# Altium footprint library Chronos.PcbLib: 65 footprints (part 1 of 5)
Each footprint in its own frame and in the unit in brackets; x right, y up, seen from the top. Pads: shape width x height; smd on the part's side, far side on the other; paste and mask are expansions set on the pad; w line width, h text height; cw(c..) or ccw(c..) is an arc to the next point about the centre after c.
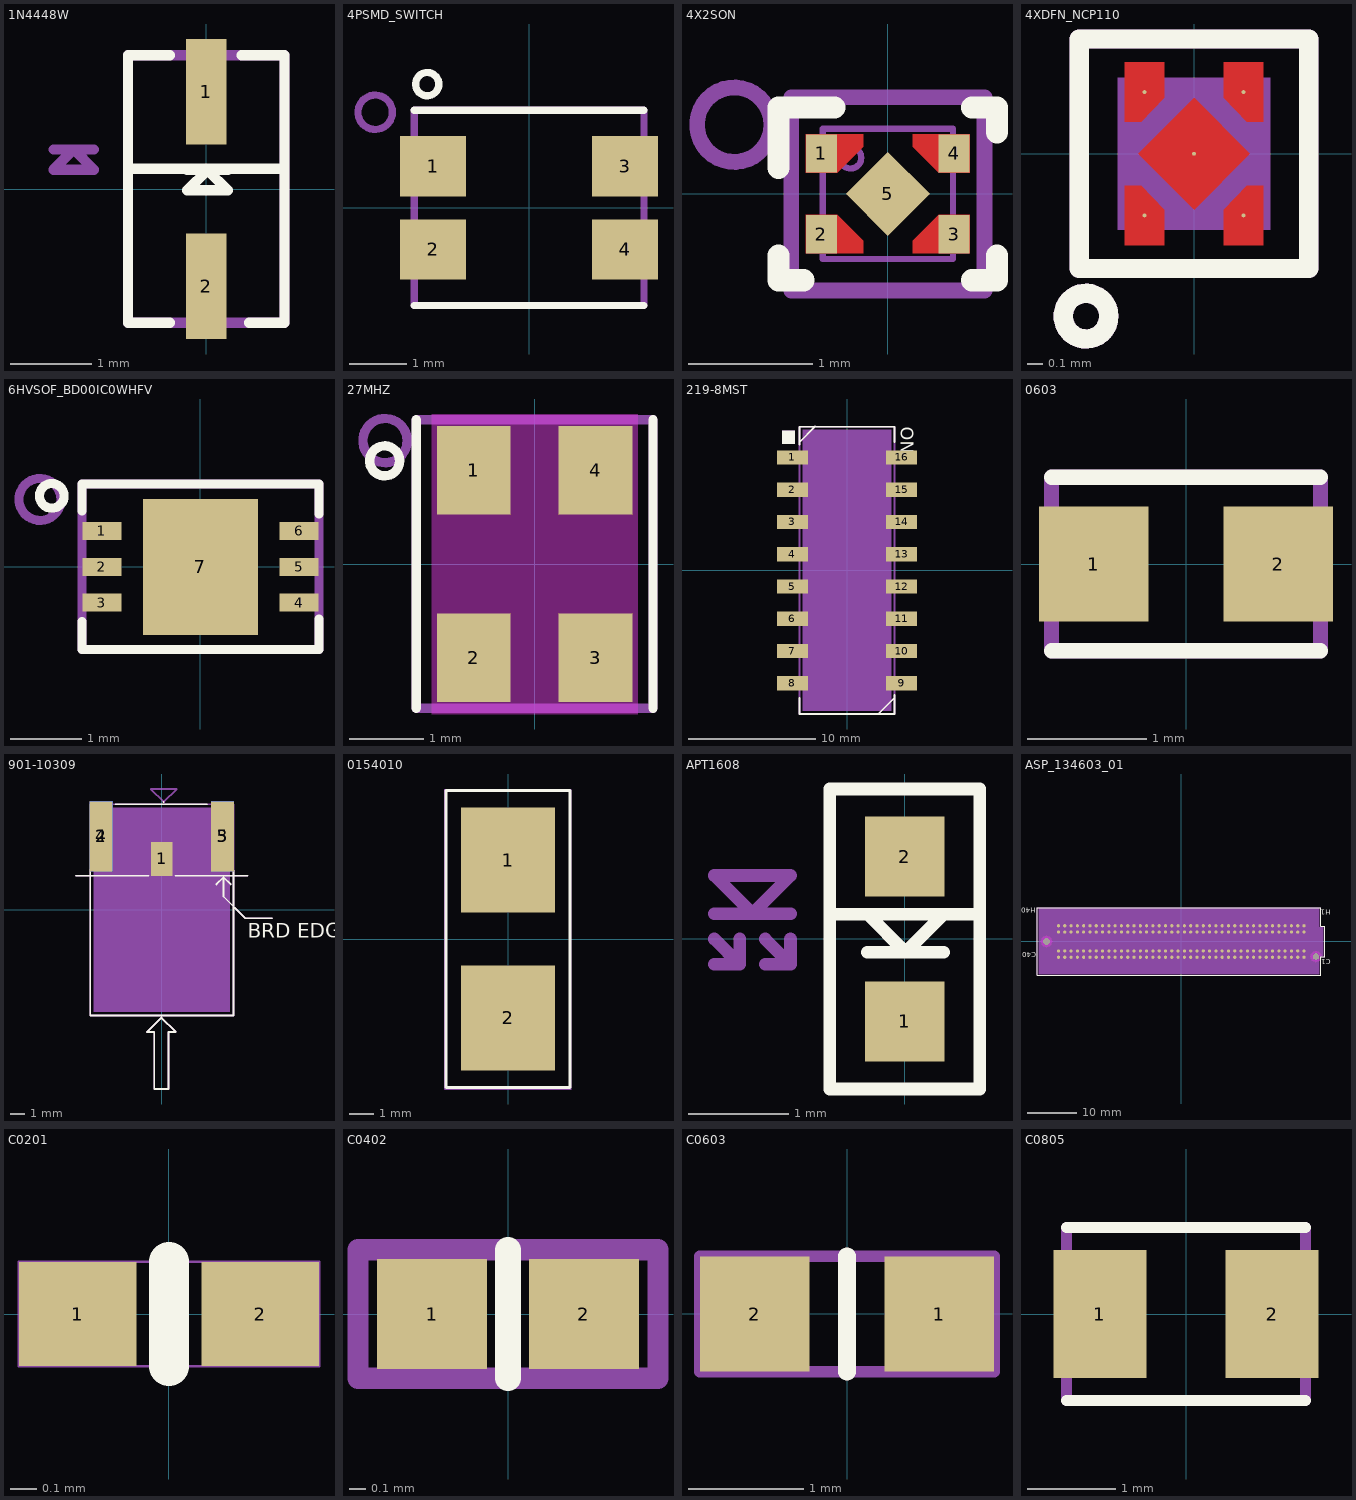
[diagram p0: the footprints below, top view; thin cyan lines are the x and y axes]

## 1N4448W [mm] "1N4448W"
pads (2):
  rect 0.5x1.3 smd: 1(0,1.2) 2(0,-1.2)
Top Overlay:
  lines w0.127: -0.889,0.254 -0.889,0.249 0.889,0.249 0.889,0.254 ; -0.45,-1.651 -0.965,-1.651 -0.965,1.651 -0.45,1.651 ; -0.234,0.234 0.267,0.234 ; 0.435,1.651 0.965,1.651 0.965,-1.651 0.528,-1.651 ; -0.234,-0.015 0.015,0.234 0.267,-0.015 -0.234,-0.015
Top Assembly:
  lines w0.127: -1.885,0.488 -1.384,0.488 ; -1.885,0.239 -1.636,0.488 -1.384,0.239 -1.885,0.239 ; -0.965,-1.651 0.965,-1.651 0.965,1.651 -0.965,1.651 -0.965,-1.651
  text ".Designator" at 1.219,0.508 h1.02
Mechanical 29:
  text "1" at 0.508,1.2 h0.64
  text "2" at 0.508,-1.2 h0.64
3D body "SOD-123.STEP": height 1.35, standoff 0, extent -0.775,-1.864 0.775,1.864

## 4PSMD_SWITCH [mm] "4PSMD_SWITCH"
pads (4):
  rect 1.15x1.05 smd: 1(-1.675,0.725) 2(-1.675,-0.725) 3(1.675,0.725) 4(1.675,-0.725)
Top Overlay:
  circle w0.127: c-1.778,2.159 r0.203
  lines w0.127: -2.004,-1.704 2.004,-1.704 ; -2.004,1.704 2.004,1.704
  text ".Designator" at -2.921,-2.921 h1.02
Top Assembly:
  circle w0.127: c-2.686,1.668 r0.3
  lines w0.127: -2.004,-1.704 2.004,-1.704 2.004,1.704 -2.004,1.704 -2.004,-1.704
Mechanical 29:
  text "4" at 1.878,-0.725 h0.51
  text "2" at -1.472,-0.725 h0.51
  text "3" at 1.878,0.725 h0.51
  text "1" at -1.472,0.725 h0.51
3D body "434153017835.stp": height 1.7, standoff 0, extent -2.147,-1.45 2.147,1.45

## 4X2SON [mm] "4X2SON"
pads (5):
  rect 0.25x0.31 smd paste-0.142 mask+0: 1(-0.535,0.325) 2(-0.535,-0.325) 3(0.535,-0.325) 4(0.535,0.325)
  rect 0.48x0.48 smd rot 45 paste-0.065 mask+0: 5(0,0)
Top Layer:
  region: -0.66,0.17 -0.66,0.48 -0.2,0.48 -0.2,0.379 -0.409,0.17
  region: 0.66,0.17 0.66,0.48 0.2,0.48 0.2,0.379 0.409,0.17
  region: 0.66,-0.17 0.66,-0.48 0.2,-0.48 0.2,-0.379 0.409,-0.17
  region: -0.66,-0.17 -0.66,-0.48 -0.2,-0.48 -0.2,-0.379 -0.409,-0.17
Top Overlay:
  lines w0.178: -0.88,-0.496 -0.88,-0.696 -0.68,-0.696 ; -0.88,0.21 -0.88,0.696 -0.43,0.696 ; 0.68,-0.696 0.88,-0.696 0.88,-0.496 ; 0.68,0.696 0.88,0.696 0.88,0.496
  text ".Designator" at -2.286,1.27 h0.6
Top Paste:
  region: -0.65,-0.22 -0.65,-0.43 -0.25,-0.43 -0.25,-0.4 -0.43,-0.22
  region: 0.65,-0.22 0.65,-0.43 0.25,-0.43 0.25,-0.4 0.43,-0.22
  region: 0.65,0.22 0.65,0.43 0.25,0.43 0.25,0.4 0.43,0.22
  region: -0.65,0.22 -0.65,0.43 -0.25,0.43 -0.25,0.4 -0.43,0.22
Top Solder:
  region: -0.61,0.22 -0.61,0.43 -0.25,0.43 -0.25,0.4 -0.43,0.22
  region: 0.25,0.43 0.61,0.43 0.61,0.22 0.43,0.22 0.25,0.4
  region: 0.61,-0.22 0.61,-0.43 0.25,-0.43 0.25,-0.4 0.43,-0.22
  region: -0.25,-0.43 -0.61,-0.43 -0.61,-0.22 -0.43,-0.22 -0.25,-0.4
Mechanical 13:
  circle w0.05: c-0.3,0.29 r0.086
  lines w0.05: -0.525,-0.525 -0.525,0.525 0.525,0.525 0.525,-0.525 -0.525,-0.525
Top Assembly:
  circle w0.127: c-1.238,0.557 r0.3
  lines w0.127: -0.779,-0.779 -0.779,0.779 0.779,0.779 0.779,-0.779 -0.779,-0.779
Mechanical 29:
  text "3" at 0.633,-0.325 h0.51
  text "4" at 0.633,0.325 h0.51
  text "1" at -0.227,0.325 h0.51
  text "2" at -0.227,-0.325 h0.51
  text "5" at 0.406,0 h0.51

## 4XDFN_NCP110 [mil] "4XDFN_NCP110"
pads (5):
  round 1 smd: 1(-12.8,-15.94) 2(12.8,-15.94) 3(12.8,15.94) 4(-12.8,15.94) 5(0,0)
Top Layer:
  region: 7.68,23.62 17.92,23.62 17.92,8.26 13.59,8.26 7.68,14.47
  region: -17.92,23.62 -7.68,23.62 -7.68,14.47 -13.59,8.26 -17.92,8.26
  region: 14.47,0 0,14.47 -14.47,0 0,-14.47
  region: 17.92,-23.62 7.68,-23.62 7.68,-14.47 13.59,-8.26 17.92,-8.26
  region: -7.68,-23.62 -17.92,-23.62 -17.92,-8.26 -13.59,-8.26 -7.68,-14.47
Top Overlay:
  circle w5: c-27.93,-42.02 r5.9
  lines w5: -29.69,-29.69 -29.69,29.69 29.69,29.69 29.69,-29.69 -29.69,-29.69
  text ".Designator" at 36.39,120.19 h40
Top 3D Body:
  region: -19.69,19.69 -19.69,-19.69 19.69,-19.69 19.69,19.69
Top Assembly:
  circle w5: c-27.93,-42.02 r5.9
  lines w5: -29.69,-29.69 29.69,-29.69 29.69,29.69 -29.69,29.69 -29.69,-29.69
Mechanical 29:
  text "2" at 12.8,0.06 h20
  text "5" at 0,16 h20
  text "4" at -12.8,31.94 h20
  text "3" at 12.8,31.94 h20
  text "1" at -12.8,0.06 h20
3D body "DQN0004A.stp": height 13.39, standoff -0.79, extent -19.68,-19.68 19.68,19.68

## 6HVSOF_BD00IC0WHFV [mm] "6HVSOF_BD00IC0WHFV"
pads (7):
  rect 0.55x0.25 smd: 1(-1.375,0.5) 2(-1.375,0) 3(-1.375,-0.5) 4(1.375,-0.5) 5(1.375,0) 6(1.375,0.5)
  rect 1.6x1.9 smd: 7(0,0)
Top Overlay:
  lines w0.127: -1.905,1.016 ccw(c-2.075,0.991) -1.903,0.984 ; -1.654,-0.766 -1.654,-1.154 1.654,-1.154 1.654,-0.726 ; -1.654,0.779 -1.654,1.154 1.654,1.154 1.654,0.735
Top Assembly:
  circle w0.127: c-2.24,0.94 r0.293
  lines w0.127: -1.654,-1.154 -1.654,1.154 1.654,1.154 1.654,-1.154 -1.654,-1.154
  text ".Designator" at 2.015,0.317 h1.02
Mechanical 29:
  text "7" at -0.203,0 h0.51
  text "3" at -1.578,-0.5 h0.51
  text "4" at 1.172,-0.5 h0.51
  text "6" at 1.172,0.5 h0.51
  text "1" at -1.578,0.5 h0.51
  text "2" at -1.578,0 h0.51
  text "5" at 1.172,0 h0.51
3D body "HVSOF6_ROM.step": height 0.76, standoff 0, extent -1.53,-0.85 1.568,0.852

## 27MHZ [mm] "27MHZ"
pads (4):
  rect 1x1.2 smd: 1(-0.825,1.27) 2(-0.825,-1.27) 3(0.825,-1.27) 4(0.825,1.27)
Mid-Layer 2 keep-out:
  region: -1.397,2.032 -1.397,-2.032 1.397,-2.032 1.397,2.032
Top Overlay:
  circle w0.127: c-2.032,1.397 r0.203
  lines w0.127: -1.604,-1.954 -1.604,1.954 ; 1.604,-1.954 1.604,1.954
  text ".Designator" at 2.032,3.302 h1.02
Top Assembly:
  circle w0.127: c-2.026,1.672 r0.3
  lines w0.127: -1.604,-1.954 -1.604,1.954 1.604,1.954 1.604,-1.954 -1.604,-1.954
Mechanical 29:
  text "2" at -0.825,-1.067 h0.51
  text "4" at 0.825,1.473 h0.51
  text "1" at -0.825,1.473 h0.51
  text "3" at 0.825,-1.067 h0.51
3D body "Abracon ASVTX-11.STEP": height 0.9, standoff 0, extent -1.26,-1.61 1.26,1.61

## 219-8MST [mil] "219-8MST"
pads (16):
  rect 96x44 smd: 1(-169.5,350) 2(-169.5,250) 3(-169.5,150) 4(-169.5,50) 5(-169.5,-50) 6(-169.5,-150) 7(-169.5,-250) 8(-169.5,-350) 9(169.5,-350) 10(169.5,-250) 11(169.5,-150) 12(169.5,-50) 13(169.5,50) 14(169.5,150) 15(169.5,250) 16(169.5,350)
Top Overlay:
  dashed: -201.38,392.57 -201.38,432.57 -161.38,432.57 -161.38,392.57
  lines w5: -148.34,396.22 -98.34,446.22 ; -147,-395.06 -147,-445 147,-445 147,-384.88 ; -147,389 -147,445 147,445 147,397.73 ; 97.17,-444.88 147.17,-394.88
  text "ON" at 166.44,444.51 h40
  text ".Designator" at 231.85,183.64 h40
Top 3D Body:
  region: -137,435 -137,-435 137,-435 137,435
Top Assembly:
  dashed: -201.38,392.57 -201.38,432.57 -161.38,432.57 -161.38,392.57
  lines w5: -148.34,396.22 -98.34,446.22 ; 97.17,-444.88 147.17,-394.88 ; -147,-445 -147,445 147,445 147,-445 -147,-445
  text "ON" at 166.44,444.51 h40
Mechanical 29:
  text "1" at -169.5,358 h20
  text "2" at -169.5,258 h20
  text "3" at -169.5,158 h20
  text "4" at -169.5,58 h20
  text "5" at -169.5,-42 h20
  text "6" at -169.5,-142 h20
  text "7" at -169.5,-242 h20
  text "8" at -169.5,-342 h20
  text "13" at 169.5,66 h20
  text "12" at 169.5,-34 h20
  text "15" at 169.5,266 h20
  text "10" at 169.5,-234 h20
  text "14" at 169.5,166 h20
  text "9" at 169.5,-342 h20
  text "11" at 169.5,-134 h20
  text "16" at 169.5,366 h20
3D body: height 150, standoff 0, extent -137,-435 137,435

## 0603 [mm] "0603"
pads (2):
  rect 0.92x0.97 smd: 1(-0.775,0) 2(0.775,0)
Top Overlay:
  lines w0.127: -1.129,-0.729 1.129,-0.729 ; -1.129,0.729 1.129,0.729
  text ".Designator" at 3.683,1.143 h1.02
Top Assembly:
  lines w0.127: -1.129,-0.729 -1.129,0.729 1.129,0.729 1.129,-0.729 -1.129,-0.729
Mechanical 29:
  text "1" at -0.978,0 h0.51
  text "2" at 0.572,0 h0.51
3D body "RES 0603.STEP": height 0.45, standoff 0, extent -0.8,-0.419 0.8,0.381

## 901-10309 [mm] "901-10309"
pads (5):
  rect 1.5x2.35 smd: 1(0,3.565)
  rect 1.6x4.9 smd: 2(-4.25,5.14) 3(4.25,5.14)
  rect 1.6x4.9 smd far side: 4(-4.25,5.14) 5(4.25,5.14)
Top Overlay:
  lines w0.127: -6,2.39 -0.928,2.39 ; -5.014,2.851 -5.014,-7.394 5.014,-7.394 5.014,2.767 ; -3.267,7.394 3.168,7.394 ; 0.125,7.557 0.131,7.557 ; 0.945,2.39 6,2.39 ; 3.821,1.783 4.321,2.284 ; 4.821,1.783 4.321,2.284 ; 7.704,-0.585 5.844,-0.585 4.321,0.938 4.321,2.284 ; -1.031,-8.543 -0.031,-7.543 0.969,-8.543 0.469,-8.543 0.469,-12.543 -0.531,-12.543 -0.531,-8.543 -1.031,-8.543
  text "BRD EDGE" at 6.034,-1.956 h1.02
  text ".Designator" at -5.221,6.586 h1.02
Top 3D Body:
  region: -4.76,7.14 -4.76,-7.14 4.76,-7.14 4.76,7.14
Bottom 3D Body:
  region: -4.76,7.14 -4.76,2.39 4.76,2.39 4.76,7.14
Top Assembly:
  lines w0.127: -6,2.39 6,2.39 ; 3.821,1.783 4.321,2.284 ; 4.821,1.783 4.321,2.284 ; 7.704,-0.585 5.844,-0.585 4.321,0.938 4.321,2.284 ; -5.014,-7.394 5.014,-7.394 5.014,7.394 -5.014,7.394 -5.014,-7.394 ; -1.031,-8.543 -0.031,-7.543 0.969,-8.543 0.469,-8.543 0.469,-12.543 -0.531,-12.543 -0.531,-8.543 -1.031,-8.543 ; -0.763,8.46 -0.763,8.465 -0.757,8.459 1.047,8.459 0.145,7.558 0.139,7.558 -0.763,8.46
  text "BRD EDGE" at 6.034,-1.956 h1.02
Mechanical 29:
  text "4" at -4.047,5.14 h0.51
  text "2" at -4.047,5.14 h0.51
  text "5" at 4.453,5.14 h0.51
  text "3" at 4.453,5.14 h0.51
  text "1" at 0.203,3.565 h0.51
Mechanical 32:
  text "BOARD THICKNESS 62MIL" at -8.541,8.874 h1.02
3D body: height 3.81, standoff 0, extent -4.76,2.39 4.76,7.14
3D body: height 3.81, standoff 0, extent -4.76,-7.14 4.76,7.14

## 0154010 [mm] "0154010"
pads (2):
  rect 3.81x4.24 smd: 1(0,3.19) 2(0,-3.19)
Top Overlay:
  lines w0.127: -2.499,-6 2.499,-6 2.499,6 -2.499,6 -2.499,-6
Top 3D Body:
  lines w0.025: -2.563,-6.063 -2.563,6.063 2.563,6.063 2.563,-6.063 -2.563,-6.063
Mechanical 29:
  text "2" at -0.508,-3.19 h0.64
  text "1" at -0.508,3.19 h0.64
3D body "0154010.DR.STEP": height 3.81, standoff 0, extent -2.515,-4.865 2.515,4.865

## APT1608 [mil] "APT1608"
pads (2):
  rect 31.5x31.5 smd: 1(0,-32.5) 2(0,32.5)
Top Overlay:
  lines w5: -29.5,9.8 29.5,9.8 ; -14.64,-5.2 15.36,-5.2 ; -29.5,-59.1 -29.5,59.1 29.5,59.1 29.5,-59.1 -29.5,-59.1 ; -14.64,9.8 0.36,-5.2 15.36,9.8 -14.64,9.8
Top Assembly:
  lines w5: -75,-10 -65,-10 ; -75,0 -65,-10 ; -75,10 -45,10 ; -65,0 -65,-10 ; -55,-10 -45,-10 ; -55,0 -45,-10 ; -45,0 -45,-10 ; -75,25 -45,25 -60,10 -75,25
Mechanical 29:
  text "2" at -20,32.5 h25
  text "1" at -20,-32.5 h25
3D body "LED 0805 Base GREEN.STEP": height 15.75, standoff 0, extent -24.61,-39.37 24.61,39.37

## ASP_134603_01 [mm] "ASP_134603_01"
pads (162):
  round 0.635 smd: C1(24.815,-3.175) C2(23.545,-3.175) C3(22.275,-3.175) C4(21.005,-3.175) C5(19.735,-3.175) C6(18.465,-3.175) C7(17.195,-3.175) C8(15.925,-3.175) C9(14.655,-3.175) C10(13.385,-3.175) C11(12.115,-3.175) C12(10.845,-3.175) C13(9.575,-3.175) C14(8.305,-3.175) C15(7.035,-3.175) C16(5.765,-3.175) C17(4.495,-3.175) C18(3.225,-3.175) C19(1.955,-3.175) C20(0.685,-3.175) C21(-0.585,-3.175) C22(-1.855,-3.175) C23(-3.125,-3.175) C24(-4.395,-3.175) C25(-5.665,-3.175) C26(-6.935,-3.175) C27(-8.205,-3.175) C28(-9.475,-3.175) C29(-10.745,-3.175) C30(-12.015,-3.175) C31(-13.285,-3.175) C32(-14.555,-3.175) C33(-15.825,-3.175) C34(-17.095,-3.175) C35(-18.365,-3.175) C36(-19.635,-3.175) C37(-20.905,-3.175) C38(-22.175,-3.175) C39(-23.445,-3.175) C40(-24.715,-3.175) D1(24.815,-1.905) D2(23.545,-1.905) D3(22.275,-1.905) D4(21.005,-1.905) D5(19.735,-1.905) D6(18.465,-1.905) D7(17.195,-1.905) D8(15.925,-1.905) D9(14.655,-1.905) D10(13.385,-1.905) D11(12.115,-1.905) D12(10.845,-1.905) D13(9.575,-1.905) D14(8.305,-1.905) D15(7.035,-1.905) D16(5.765,-1.905) D17(4.495,-1.905) D18(3.225,-1.905) D19(1.955,-1.905) D20(0.685,-1.905) D21(-0.585,-1.905) D22(-1.855,-1.905) D23(-3.125,-1.905) D24(-4.395,-1.905) D25(-5.665,-1.905) D26(-6.935,-1.905) D27(-8.205,-1.905) D28(-9.475,-1.905) D29(-10.745,-1.905) D30(-12.015,-1.905) D31(-13.285,-1.905) D32(-14.555,-1.905) D33(-15.825,-1.905) D34(-17.095,-1.905) D35(-18.365,-1.905) D36(-19.635,-1.905) D37(-20.905,-1.905) D38(-22.175,-1.905) D39(-23.445,-1.905) D40(-24.715,-1.905) G1(24.815,1.905) G2(23.545,1.905) G3(22.275,1.905) G4(21.005,1.905) G5(19.735,1.905) G6(18.465,1.905) G7(17.195,1.905) G8(15.925,1.905) G9(14.655,1.905) G10(13.385,1.905) G11(12.115,1.905) G12(10.845,1.905) G13(9.575,1.905) G14(8.305,1.905) G15(7.035,1.905) G16(5.765,1.905) G17(4.495,1.905) G18(3.225,1.905) G19(1.955,1.905) G20(0.685,1.905) G21(-0.585,1.905) G22(-1.855,1.905) G23(-3.125,1.905) G24(-4.395,1.905) G25(-5.665,1.905) G26(-6.935,1.905) G27(-8.205,1.905) G28(-9.475,1.905) G29(-10.745,1.905) G30(-12.015,1.905) G31(-13.285,1.905) G32(-14.555,1.905) G33(-15.825,1.905) G34(-17.095,1.905) G35(-18.365,1.905) G36(-19.635,1.905) G37(-20.905,1.905) G38(-22.175,1.905) G39(-23.445,1.905) G40(-24.715,1.905) H1(24.815,3.175) H2(23.545,3.175) H3(22.275,3.175) H4(21.005,3.175) H5(19.735,3.175) H6(18.465,3.175) H7(17.195,3.175) H8(15.925,3.175) H9(14.655,3.175) H10(13.385,3.175) H11(12.115,3.175) H12(10.845,3.175) H13(9.575,3.175) H14(8.305,3.175) H15(7.035,3.175) H16(5.765,3.175) H17(4.495,3.175) H18(3.225,3.175) H19(1.955,3.175) H20(0.685,3.175) H21(-0.585,3.175) H22(-1.855,3.175) H23(-3.125,3.175) H24(-4.395,3.175) H25(-5.665,3.175) H26(-6.935,3.175) H27(-8.205,3.175) H28(-9.475,3.175) H29(-10.745,3.175) H30(-12.015,3.175) H31(-13.285,3.175) H32(-14.555,3.175) H33(-15.825,3.175) H34(-17.095,3.175) H35(-18.365,3.175) H36(-19.635,3.175) H37(-20.905,3.175) H38(-22.175,3.175) H39(-23.445,3.175) H40(-24.715,3.175)
  round 1.27 hole 1.27 unplated: ""(-27.128,0) ""(27.228,-3.048)
Top Overlay:
  lines w0.127: -28.969,-6.854 -28.969,6.854 28.169,6.854 28.169,3.104 28.969,3.104 28.969,-3.104 28.169,-3.104 28.169,-6.854 -28.969,-6.854
  text "C40" at -29.173,-2.12 h1.02
  text "H40" at -29.249,6.846 h1.02
  text "H1" at 30.25,6.389 h1.02
  text "C1" at 30.25,-3.593 h1.02
  text ".Designator" at -25.365,-7.279 h1.02
Top 3D Body:
  region: -28.715,-6.6 -28.715,6.6 27.915,6.6 27.915,2.85 28.715,2.85 28.715,-2.85 27.915,-2.85 27.915,-6.6
Multi-Layer keep-out:
  region: -28.242,0 -28.204,-0.288 -28.093,-0.557 -27.916,-0.788 -27.685,-0.965 -27.416,-1.076 -27.128,-1.114 -26.84,-1.076 -26.571,-0.965 -26.34,-0.788 -26.163,-0.557 -26.052,-0.288 -26.014,0 -26.052,0.288 -26.163,0.557 -26.34,0.788 -26.571,0.965 -26.84,1.076 -27.128,1.114 -27.416,1.076 -27.685,0.965 -27.916,0.788 -28.093,0.557 -28.204,0.288
  region: -28.242,0 -28.204,-0.288 -28.093,-0.557 -27.916,-0.788 -27.685,-0.965 -27.416,-1.076 -27.128,-1.114 -26.84,-1.076 -26.571,-0.965 -26.34,-0.788 -26.163,-0.557 -26.052,-0.288 -26.014,0 -26.052,0.288 -26.163,0.557 -26.34,0.788 -26.571,0.965 -26.84,1.076 -27.128,1.114 -27.416,1.076 -27.685,0.965 -27.916,0.788 -28.093,0.557 -28.204,0.288
  region: 26.114,-3.048 26.152,-3.336 26.263,-3.605 26.44,-3.836 26.671,-4.013 26.94,-4.124 27.228,-4.162 27.516,-4.124 27.785,-4.013 28.016,-3.836 28.193,-3.605 28.304,-3.336 28.342,-3.048 28.304,-2.76 28.193,-2.491 28.016,-2.26 27.785,-2.083 27.516,-1.972 27.228,-1.934 26.94,-1.972 26.671,-2.083 26.44,-2.26 26.263,-2.491 26.152,-2.76
  region: 26.114,-3.048 26.152,-3.336 26.263,-3.605 26.44,-3.836 26.671,-4.013 26.94,-4.124 27.228,-4.162 27.516,-4.124 27.785,-4.013 28.016,-3.836 28.193,-3.605 28.304,-3.336 28.342,-3.048 28.304,-2.76 28.193,-2.491 28.016,-2.26 27.785,-2.083 27.516,-1.972 27.228,-1.934 26.94,-1.972 26.671,-2.083 26.44,-2.26 26.263,-2.491 26.152,-2.76
Top Assembly:
  lines w0.127: -28.969,-6.854 -28.969,6.854 28.169,6.854 28.169,3.104 28.969,3.104 28.969,-3.104 28.169,-3.104 28.169,-6.854 -28.969,-6.854
  text "C1" at 28.821,-3.502 h0.51
  text "H1" at 28.947,3.155 h0.51
  text "H40" at -29.566,3.19 h0.51
  text "C40" at -29.588,-3.205 h0.51
Mechanical 29:
  text "D34" at -16.485,-1.905 h0.51
  text "H38" at -21.565,3.175 h0.51
  text "H39" at -22.835,3.175 h0.51
  text "H36" at -19.025,3.175 h0.51
  text "H33" at -15.215,3.175 h0.51
  text "H30" at -11.405,3.175 h0.51
  text "H27" at -7.595,3.175 h0.51
  text "H24" at -3.785,3.175 h0.51
  text "H21" at 0.025,3.175 h0.51
  text "H18" at 3.835,3.175 h0.51
  text "H15" at 7.645,3.175 h0.51
  text "H12" at 11.455,3.175 h0.51
  text "H9" at 15.061,3.175 h0.51
  text "H6" at 18.871,3.175 h0.51
  text "H3" at 22.681,3.175 h0.51
  text "G40" at -24.105,1.905 h0.51
  text "G38" at -21.565,1.905 h0.51
  text "G35" at -17.755,1.905 h0.51
  text "G32" at -13.945,1.905 h0.51
  text "G29" at -10.135,1.905 h0.51
  text "G26" at -6.325,1.905 h0.51
  text "G23" at -2.515,1.905 h0.51
  text "G20" at 1.295,1.905 h0.51
  text "G17" at 5.105,1.905 h0.51
  text "G14" at 8.915,1.905 h0.51
  text "G11" at 12.725,1.905 h0.51
  text "G8" at 16.331,1.905 h0.51
  text "G5" at 20.141,1.905 h0.51
  text "G4" at 21.411,1.905 h0.51
  text "D39" at -22.835,-1.905 h0.51
  text "D37" at -20.295,-1.905 h0.51
  text "D35" at -17.755,-1.905 h0.51
  text "D28" at -8.865,-1.905 h0.51
  text "D25" at -5.055,-1.905 h0.51
  text "D22" at -1.245,-1.905 h0.51
  text "D19" at 2.565,-1.905 h0.51
  text "D16" at 6.375,-1.905 h0.51
  text "D13" at 10.185,-1.905 h0.51
  text "D10" at 13.995,-1.905 h0.51
  text "D7" at 17.601,-1.905 h0.51
  text "D6" at 18.871,-1.905 h0.51
  text "D3" at 22.681,-1.905 h0.51
  text "D2" at 23.951,-1.905 h0.51
  text "C40" at -24.105,-3.175 h0.51
  text "C38" at -21.565,-3.175 h0.51
  text "C36" at -19.025,-3.175 h0.51
  text "C34" at -16.485,-3.175 h0.51
  text "C33" at -15.215,-3.175 h0.51
  text "C32" at -13.945,-3.175 h0.51
  text "C29" at -10.135,-3.175 h0.51
  text "C28" at -8.865,-3.175 h0.51
  text "C25" at -5.055,-3.175 h0.51
  text "C24" at -3.785,-3.175 h0.51
  text "C21" at 0.025,-3.175 h0.51
  text "C20" at 1.295,-3.175 h0.51
  text "C17" at 5.105,-3.175 h0.51
  text "C16" at 6.375,-3.175 h0.51
  text "C13" at 10.185,-3.175 h0.51
  text "C12" at 11.455,-3.175 h0.51
  text "C9" at 15.061,-3.175 h0.51
  text "C8" at 16.331,-3.175 h0.51
  text "C5" at 20.141,-3.175 h0.51
  text "C4" at 21.411,-3.175 h0.51
  text "G1" at 25.221,1.905 h0.51
  text "C1" at 25.221,-3.175 h0.51
  text "C37" at -20.295,-3.175 h0.51
  text "C35" at -17.755,-3.175 h0.51
  text "D40" at -24.105,-1.905 h0.51
  text "D38" at -21.565,-1.905 h0.51
  text "D36" at -19.025,-1.905 h0.51
  text "D32" at -13.945,-1.905 h0.51
  text "C39" at -22.835,-3.175 h0.51
  text "C30" at -11.405,-3.175 h0.51
  text "D26" at -6.325,-1.905 h0.51
  text "D27" at -7.595,-1.905 h0.51
  text "C22" at -1.245,-3.175 h0.51
  text "D20" at 1.295,-1.905 h0.51
  text "C31" at -12.675,-3.175 h0.51
  text "D17" at 5.105,-1.905 h0.51
  text "D29" at -10.135,-1.905 h0.51
  text "H10" at 13.995,3.175 h0.51
  text "C23" at -2.515,-3.175 h0.51
  text "H34" at -16.485,3.175 h0.51
  text "D12" at 11.455,-1.905 h0.51
  text "C26" at -6.325,-3.175 h0.51
  text "C27" at -7.595,-3.175 h0.51
  text "H31" at -12.675,3.175 h0.51
  text "G27" at -7.595,1.905 h0.51
  text "H2" at 23.951,3.175 h0.51
  text "G2" at 23.951,1.905 h0.51
  text "H22" at -1.245,3.175 h0.51
  text "G28" at -8.865,1.905 h0.51
  text "G21" at 0.025,1.905 h0.51
  text "H32" at -13.945,3.175 h0.51
  text "D18" at 3.835,-1.905 h0.51
  text "H23" at -2.515,3.175 h0.51
  text "H25" at -5.055,3.175 h0.51
  text "G30" at -11.405,1.905 h0.51
  text "G10" at 13.995,1.905 h0.51
  text "D31" at -12.675,-1.905 h0.51
  text "G12" at 11.455,1.905 h0.51
  text "D24" at -3.785,-1.905 h0.51
  text "D21" at 0.025,-1.905 h0.51
  text "H7" at 17.601,3.175 h0.51
  text "D30" at -11.405,-1.905 h0.51
  text "H35" at -17.755,3.175 h0.51
  text "C18" at 3.835,-3.175 h0.51
  text "H1" at 25.221,3.175 h0.51
  text "G19" at 2.565,1.905 h0.51
  text "G24" at -3.785,1.905 h0.51
  text "G3" at 22.681,1.905 h0.51
  text "H20" at 1.295,3.175 h0.51
  text "D9" at 15.061,-1.905 h0.51
  text "H4" at 21.411,3.175 h0.51
  text "H11" at 12.725,3.175 h0.51
  text "D11" at 12.725,-1.905 h0.51
  text "H19" at 2.565,3.175 h0.51
  text "H14" at 8.915,3.175 h0.51
  text "C19" at 2.565,-3.175 h0.51
  text "H17" at 5.105,3.175 h0.51
  text "G7" at 17.601,1.905 h0.51
  text "G13" at 10.185,1.905 h0.51
  text "G16" at 6.375,1.905 h0.51
  text "D33" at -15.215,-1.905 h0.51
  text "H29" at -10.135,3.175 h0.51
  text "G6" at 18.871,1.905 h0.51
  text "G25" at -5.055,1.905 h0.51
  text "C10" at 13.995,-3.175 h0.51
  text "G22" at -1.245,1.905 h0.51
  text "H37" at -20.295,3.175 h0.51
  text "D15" at 7.645,-1.905 h0.51
  text "G18" at 3.835,1.905 h0.51
  text "H5" at 20.141,3.175 h0.51
  text "C15" at 7.645,-3.175 h0.51
  text "H26" at -6.325,3.175 h0.51
  text "H16" at 6.375,3.175 h0.51
  text "C14" at 8.915,-3.175 h0.51
  text "G9" at 15.061,1.905 h0.51
  text "H8" at 16.331,3.175 h0.51
  text "G34" at -16.485,1.905 h0.51
  text "D14" at 8.915,-1.905 h0.51
  text "D1" at 25.221,-1.905 h0.51
  text "D8" at 16.331,-1.905 h0.51
  text "H13" at 10.185,3.175 h0.51
  text "G33" at -15.215,1.905 h0.51
  text "C11" at 12.725,-3.175 h0.51
  text "G31" at -12.675,1.905 h0.51
  text "G15" at 7.645,1.905 h0.51
  text "H28" at -8.865,3.175 h0.51
  text "D23" at -2.515,-1.905 h0.51
  text "G37" at -20.295,1.905 h0.51
  text "D4" at 21.411,-1.905 h0.51
  text "D5" at 20.141,-1.905 h0.51
  text "H40" at -24.105,3.175 h0.51
  text "G39" at -22.835,1.905 h0.51
  text "C6" at 18.871,-3.175 h0.51
  text "C2" at 23.951,-3.175 h0.51
  text "C3" at 22.681,-3.175 h0.51
  text "C7" at 17.601,-3.175 h0.51
  text "G36" at -19.025,1.905 h0.51
3D body: height 3.81, standoff 0, extent -28.715,-6.6 28.715,6.6

## C0201 [mm] "C0201"
pads (2):
  rect 0.45x0.4 smd: 1(-0.35,0) 2(0.35,0)
Top Overlay:
  lines w0.152: 0,-0.2 0,0.2
Top Assembly:
  lines w0.01: -0.575,-0.2 0.575,-0.2 0.575,0.2 -0.575,0.2 -0.575,-0.2
Mechanical 29:
  text "1" at -0.553,0 h0.51
  text "2" at 0.147,0 h0.51
Bottom Assembly:
  text ".Designator" at -1.524,-0.423 h1.27
3D body "Murata - GJM033.step": height 0.34, standoff 0.01, extent -0.322,-0.158 0.308,0.172

## C0402 [mm] "C0402"
pads (2):
  rect 0.65x0.65 smd: 1(-0.45,0) 2(0.45,0)
Top Overlay:
  lines w0.152: 0,-0.381 0,0.381
Top Assembly:
  lines w0.127: -0.889,-0.381 -0.889,0.381 0.889,0.381 0.889,-0.381 -0.889,-0.381
Mechanical 29:
  text "2" at 0.653,0 h0.51
  text "1" at -0.247,0 h0.51
3D body "CAP 0402.STEP": height 0.52, standoff 0, extent -0.5,-0.262 0.5,0.262

## C0603 [mm] "C0603"
pads (2):
  rect 0.95x1 smd: 1(0.8,0) 2(-0.8,0)
Top Overlay:
  lines w0.152: 0,-0.5 0,0.5
Top Assembly:
  lines w0.102: -1.275,-0.5 1.275,-0.5 1.275,0.5 -1.275,0.5 -1.275,-0.5
Mechanical 29:
  text "2" at -0.8,-0.203 h0.51
  text "1" at 0.8,-0.203 h0.51
Bottom Assembly:
  text ".Designator" at 0,-1.101 h1.27
3D body "CAP 0603.STEP": height 0.82, standoff 0, extent -0.8,-0.412 0.8,0.412

## C0805 [mm] "C0805"
pads (2):
  rect 1.05x1.45 smd: 1(-0.975,0) 2(0.975,0)
Top Overlay:
  lines w0.127: -1.354,-0.979 1.354,-0.979 ; -1.354,0.979 1.354,0.979
Top Assembly:
  lines w0.127: -1.354,-0.979 1.354,-0.979 1.354,0.979 -1.354,0.979 -1.354,-0.979
  text ".Designator" at 1.681,-0.03 h1.02
Mechanical 29:
  text "1" at -0.975,-0.61 h1.52
  text "2" at 0.975,-0.61 h1.52
3D body "CAP 0805.STEP": height 1.27, standoff 0, extent -1,-0.637 1,0.637